# Altium integrated library Mastermind Devices.IntLib: 910 symbols (part 6 of 6)
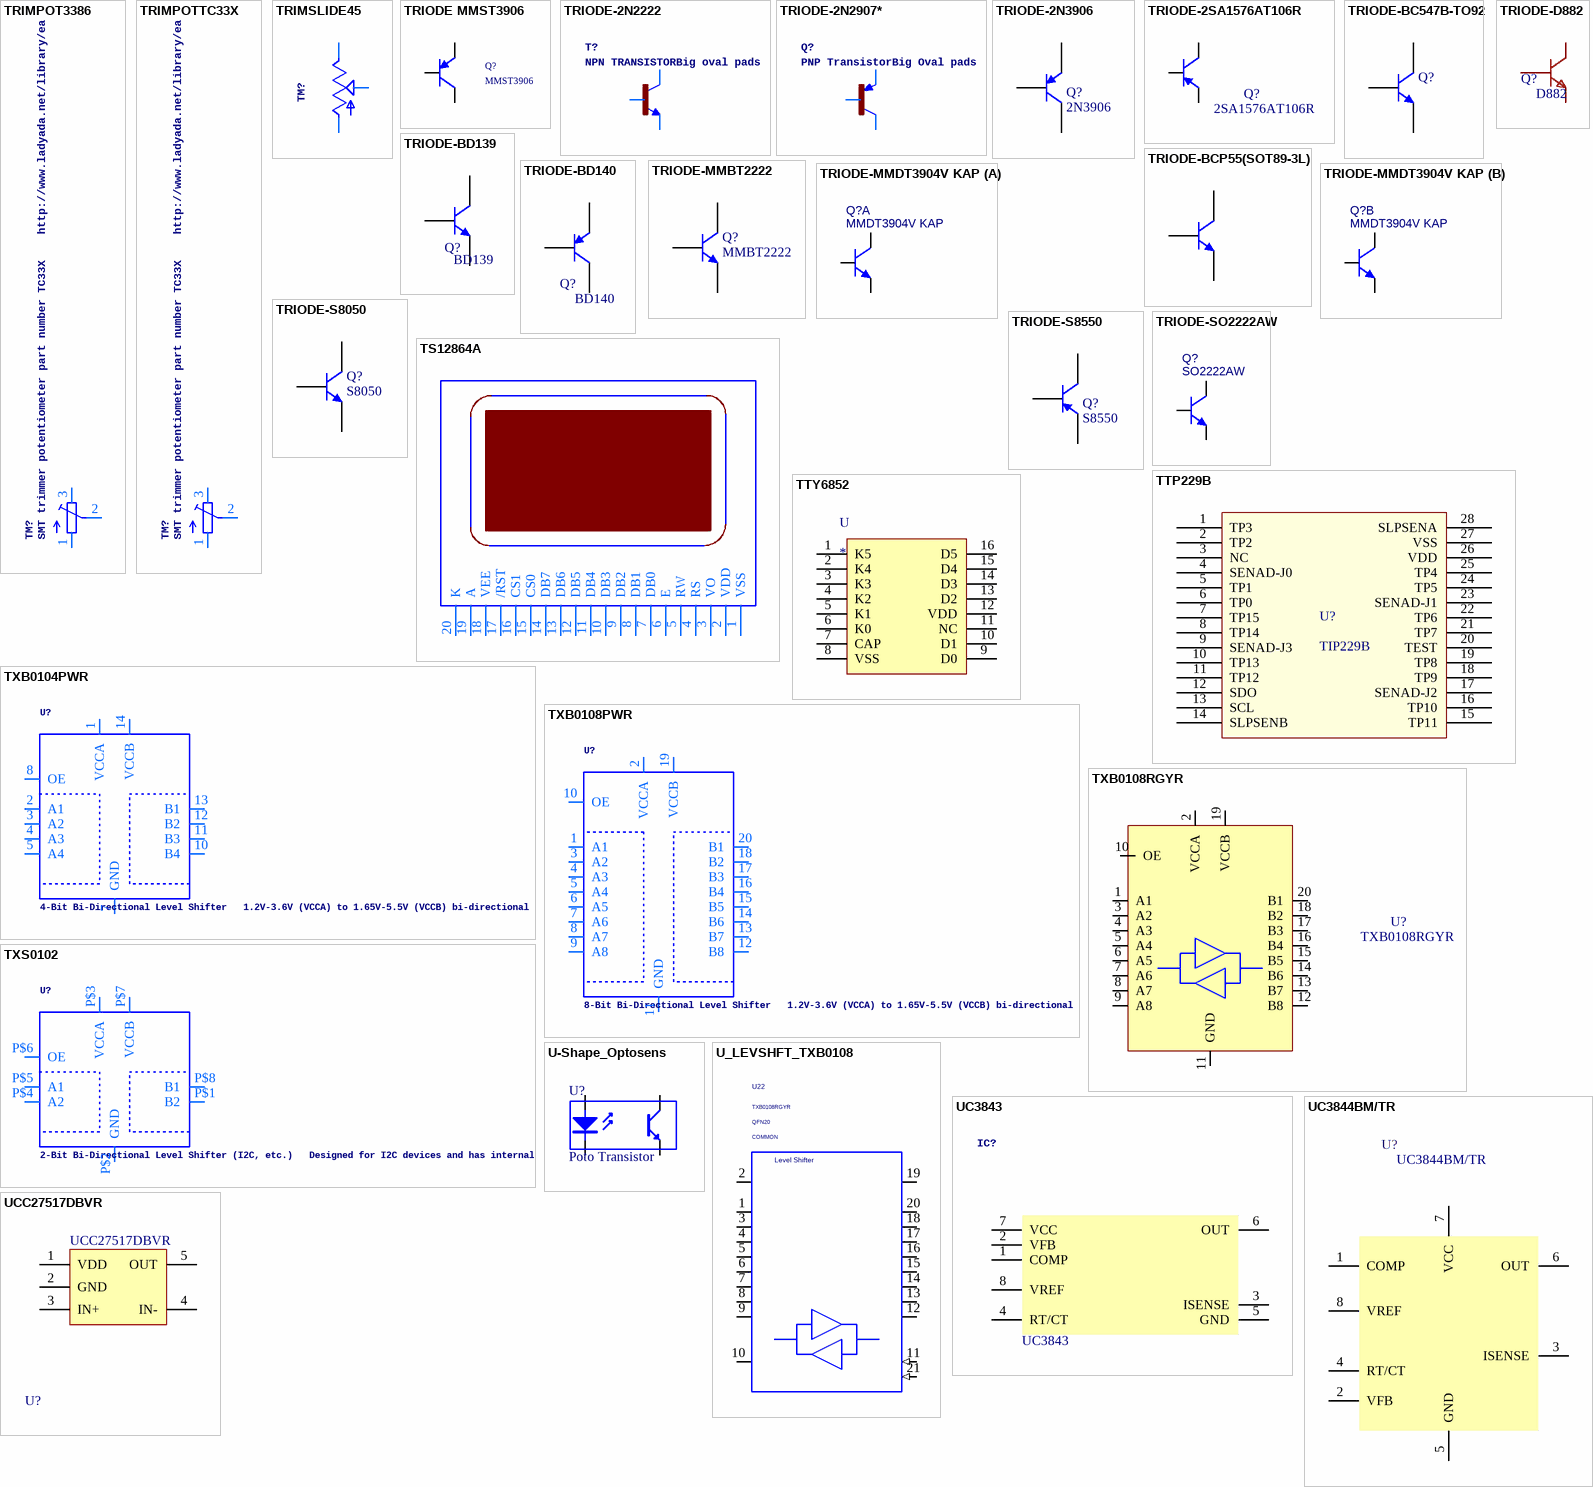
[diagram p44: symbols TRIMPOT3386 to UCC27517DBVR]

## TXB0108PWR
designator U?, comment 8-Bit Bi-Directional Level Shifter   1.2V-3.6V (VCCA) to 1.65V-5.5V (VCCB) bi-directional level shifter with auto direction sensing.    Max data rate - VCCA 1.8V:  20Mbps (50ns), VCCA 3.3V: 100Mbps (10ns)       Digikey: 296-21527-1-ND
footprint TSSOP20
pins: 1 A1, 2 VCCA, 3 A2, 4 A3, 5 A4, 6 A5, 7 A6, 8 A7, 9 A8, 10 OE, 11 GND, 12 B8, 13 B7, 14 B6, 15 B5, 16 B4, 17 B3, 18 B2, 19 VCCB, 20 B1

## TXB0108RGYR
designator U?
1.65V~5.5V 1 8 1.2V~3.6V 100Mbps VQFN-20-EP(3.5x4.5) Translators, Level Shifters ROHS; Manufacturer: TI(德州仪器); Add into BOM: yes; Channel Type: Bidirectional; Number of Circuits: 1; Channels per Circuit: 8; Output Type: Tri-State；Non-inverting; Symbol: TXB0108RGYR; Device: TXB0108RGYR; LCSC Part Name: 100Mbps 8位双向电平转换器; Supplier Part: C194701; Manufacturer Part: TXB0108RGYR; Supplier Footprint: VQFN-20-EP(3.5x4.5); JLCPCB Part Class: Extended Part; Datasheet: https://atta.szlcsc.com/upload/public/pdf/source/20200527/C194701_912976D4DBA928C9D2968FAC041F03B8.pdf; Supplier: LCSC; Convert to PCB: yes; Input Signal: -; Output Signal: -; Data Rate: 100Mbps; Supply Voltage (VCCA): 1.2V~3.6V; Supply Voltage (VCCB): 1.65V~5.5V; Operating Temperature: -40℃~+85℃; Features: Automatic Direction Detection
footprint VQFN-20_L4.5-W3.5-P0.50-BL-EP
3D model VQFN-20_L4.5-W3.5-H1.0-P0.50-BL-EP
pins: 1 A1, 2 VCCA, 3 A2, 4 A3, 5 A4, 6 A5, 7 A6, 8 A7, 9 A8, 10 OE, 11 GND, 12 B8, 13 B7, 14 B6, 15 B5, 16 B4, 17 B3, 18 B2, 19 VCCB, 20 B1, 21 EP hidden to GND

## TXS0102
designator U?, comment 2-Bit Bi-Directional Level Shifter (I2C, etc.)   Designed for I2C devices and has internal pullups.  Not to be confused with TXB010x series.   1.2V-3.6V (VCCA) to 1.65V-5.5V (VCCB) bi-directional level shifter with auto direction sensing.    Max data rate - 24Mbps (Push Pull), 2Mbps (Open Drain)       Digikey: 296-21931-1-ND
footprint VFSOP-8
pins: P$1 B2, P$2 GND, P$3 VCCA, P$4 A2, P$5 A1, P$6 OE, P$7 VCCB, P$8 B1

## U-Shape_Optosens
designator U?, comment Poto Transistor
4-Pin Phototransistor Optocoupler; Published: 24-Mar-1999; LatestRevisionDate: 04-Mar-2005; LatestRevisionNote: Sch pins 3 & 4 Swapped.; DatasheetVersion: Nov-2003; PackageReference: DIP-4; Publisher: Altium Limited
footprint JST_B4B-XH-A(LF)(SN)
footprint JST-PH2.0-4PINS
footprint U_Shape_Opto
pins: 1 A "Anode", 2 K "Cathode", 3 C "Collector", 4 E "Emitter"

## U_LEVSHFT_TXB0108
designator U22  SKU: COMMON  PACK_TYPE: QFN20  NV_NAME: TXB0108RGYR  (hidden comment: U_LEVSHFT_TXB0108)
CDS_PART_NAME: U_LEVSHFT_TXB0108_QFN20-TXB0108RGYR,LEVEL SHIFTER,115-1921-000; CDS_PHYS_PART_NAME: U_LEVSHFT_TXB0108_QFN20-TXB0108RGYR,LEVEL SHIFTER,115-1921-000-115-1921-000; OriginalSymbolOrigin: (-250,350); PATH: I116; NV_PN: 115-1921-000; FUNCTION: Level Shifter; CDS_LMAN_SYM_OUTLINE: -250,350,250,-450; ASSEMBLY: GPIO_HDR; CDS_LIB: digital; CDS_LOCATION: U22; CDS_SEC: 1; DEVICE_TYPENAME: U_LEVSHFT_TXB0108_QFN20-TXB0108RGYRLEVELSHIFTER115-1921-000-115-1921-000; DRAWING: @P3449_B01_LIB.P3449_B01(SCH_1):PAGE19; PHYS_PAGE: 19; ROT: 0; XY: (-9150,5200); PCB Footprint: QFN020R_P050_0045X0035_T031X021_VIAS; PLACEMENT_NOTE: ?; CHIPS_PART_NAME: U_LEVSHFT_TXB0108; LOCATION: U22; SEC_TYPE: QFN20; VER: 1; SEC: 1
footprint QFN020R_P050_0045X0035_T031X021_VIAS
pins: 1 A1 (io), 2 VCCA (power), 3 A2 (io), 4 A3 (io), 5 A4 (io), 6 A5 (io), 7 A6 (io), 8 A7 (io), 9 A8 (io), 10 OE (io), 11 GND (in), 12 B8 (io), 13 B7 (io), 14 B6 (io), 15 B5 (io), 16 B4 (io), 17 B3 (io), 18 B2 (io), 19 VCCB (power), 20 B1 (io), 21 EP (in)

## UC3843
designator IC?  Name: UC3843
footprint SOIC-8E (SOIC, 8-Leads, Body 4.90x3.90mm, Pitch 1.27mm, IPC Medium Density)
pins: 1 COMP (power), 2 VFB, 3 ISENSE, 4 RT/CT (power), 5 GND, 6 OUT, 7 VCC, 8 VREF

## UC3844BM/TR
designator U?
Manufacturer: HGSEMI(华冠); Add into BOM: yes; Symbol: UC3844BM/TR; Device: UC3844BM/TR; LCSC Part Name: UC3844BM/TR; Supplier Part: C2987352; Manufacturer Part: UC3844BM/TR; Supplier Footprint: SOP-8; JLCPCB Part Class: Extended Part; Datasheet: https://atta.szlcsc.com/upload/public/pdf/source/20220406/1010CC7FB2B129E1616D2257145C6E1B.pdf; Supplier: LCSC; Convert to PCB: yes
footprint SOIC-8E (SOIC, 8-Leads, Body 4.90x3.90mm, Pitch 1.27mm, IPC Medium Density)
footprint SOIC-8_L4.9-W3.9-P1.27-LS6.0-BL
pins: 1 COMP (power), 2 VFB, 3 ISENSE, 4 RT/CT (power), 5 GND, 6 OUT, 7 VCC, 8 VREF

## UCC27517DBVR
designator U?
Gate Drive ICs ROHS; Name: UCC27517DBVR
footprint SOT23-5L
pins: 1 VDD, 2 GND, 3 IN+, 4 IN- (power), 5 OUT (power)

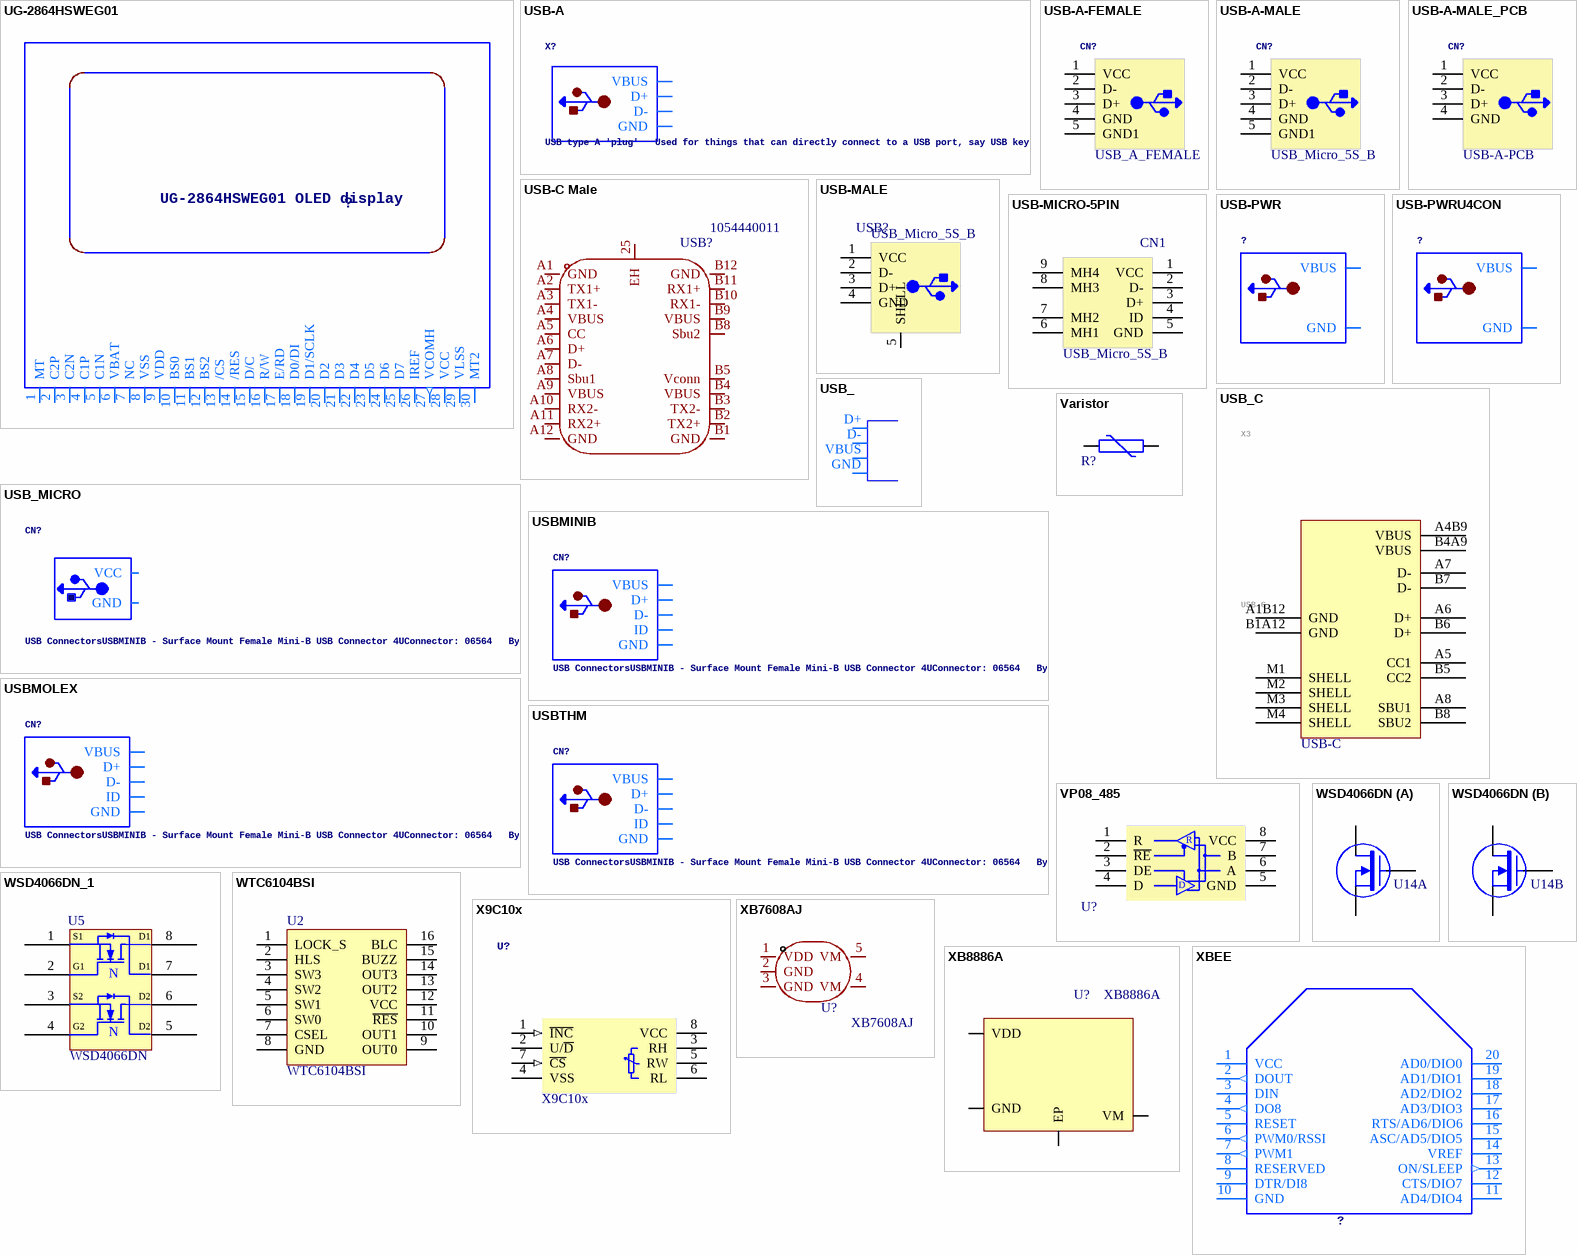
[diagram p37: symbols UG-2864HSWEG01 to XBEE]

## UG-2864HSWEG01
designator ?, comment UG-2864HSWEG01 OLED display
footprint 1X30-0.7MM
pins: 1 MT, 2 C2P, 3 C2N, 4 C1P, 5 C1N, 6 VBAT, 7 NC, 8 VSS (power), 9 VDD (power), 10 BS0, 11 BS1, 12 BS2, 13 /CS, 14 /RES, 15 D/C, 16 R/W, 17 E/RD, 18 D0/DI, 19 D1/SCLK, 20 D2, 21 D3, 22 D4, 23 D5, 24 D6, 25 D7, 26 IREF, 27 VCOMH (out), 28 VCC (power), 29 VLSS (power), 30 MT2

## USB-A
designator X?, comment USB type A 'plug'   Used for things that can directly connect to a USB port, say USB key
footprint MOLEX_480371000
pins: 1 VBUS (power), 2 D-, 3 D+, 4 GND (power)

## USB-A-FEMALE
designator CN?, comment NAME: USB_A_FEMALE  (hidden comment: USB ConnectorsUSBMINIB - Surface Mount Female Mini-B USB Connector 4UConnector: 06564   By microbuilder.euThru-hole RA Female Mini-B USB Connector 4UConnector: 18732   By ladyada.net)
footprint USB-A-SMD_U-A-24DS-Y-1
pins: 1 VCC (power), 2 D-, 3 D+, 4 GND, 5 GND1 (power)

## USB-A-MALE
designator CN?, comment NAME: USB_Micro_5S_B  (hidden comment: USB ConnectorsUSBMINIB - Surface Mount Female Mini-B USB Connector 4UConnector: 06564   By microbuilder.euThru-hole RA Female Mini-B USB Connector 4UConnector: 18732   By ladyada.net)
footprint USB-A-TH_48037-0001
pins: 1 VCC (power), 2 D-, 3 D+, 4 GND, 5 GND1 (power)

## USB-A-MALE_PCB
designator CN?, comment NAME: USB-A-PCB  (hidden comment: USB ConnectorsUSBMINIB - Surface Mount Female Mini-B USB Connector 4UConnector: 06564   By microbuilder.euThru-hole RA Female Mini-B USB Connector 4UConnector: 18732   By ladyada.net)
footprint USB-A-PCB
pins: 1 VCC (power), 2 D-, 3 D+, 4 GND

## USB-C Male
designator USB?, comment 1054440011
Manufacturer: MOLEX; Add into BOM: yes; Connector Type: Type-C; Gender: Male; Number of Contacts: 24P; Number of Ports: 1; Symbol: 1054440011; Device: 1054440011; LCSC Part Name: Type-C 公 夹板; Supplier Part: C561769; Manufacturer Part: 1054440011; Supplier Footprint: SMD; JLCPCB Part Class: Extended Part; Datasheet: https://www.molex.com/content/dam/molex/molex-dot-com/products/automated/en-us/salesdrawingpdf/105/105444/1054440011_sd.pdf?inline\; Supplier: LCSC; Convert to PCB: yes; Protocol Standard: -; Mounting Type: Clamp board; Current Rating-Power: -; Operating Temperature: -
footprint USB-C-SMD_C561769
3D model USB-C-SMD_C561769
pins: 25 EH, A1 GND, A2 TX1+, A3 TX1-, A4 VBUS, A5 CC, A6 D+, A7 D-, A8 Sbu1, A9 VBUS, A10 RX2-, A11 RX2+, A12 GND, B1 GND, B2 TX2+, B3 TX2-, B4 VBUS, B5 Vconn, B8 Sbu2, B9 VBUS, B10 RX1-, B11 RX1+, B12 GND

## USB-MALE
designator USB?, comment NAME: USB_Micro_5S_B  (hidden comment: USB Connectors)
Plugin USB Connectors ROHS
footprint USB-A-TH_48037-0001
footprint USB-A-SMT_48037-0001
pins: 1 VCC (power), 2 D-, 3 D+, 4 GND, 5 SHELL (power)

## USB-MICRO-5PIN
designator CN1, comment NAME: USB_Micro_5S_B  (hidden comment: USB ConnectorsUSBMINIB - Surface Mount Female Mini-B USB Connector 4UConnector: 06564   By microbuilder.euThru-hole RA Female Mini-B USB Connector 4UConnector: 18732   By ladyada.net)
footprint USB-MICRO2.0-5Pin
footprint USB-MICRO-SMD_5P-P0.65-H-M_MICRO-USB-5P
footprint USB-Micro-B-RA-SMD-PiP
pins: 1 VCC (power), 2 D-, 3 D+, 4 ID, 5 GND (power), 6 MH1 (power), 7 MH2 (power), 8 MH3 (power), 9 MH4 (power)

## USB-PWR
designator ?
footprint USB-MINIB-THM-MOLEX-PWRONLY
pins: GND (power), VBUS (power)

## USB-PWRU4CON
designator ?
footprint USB-MINIB-THM-PWRONLY
pins: GND (power), VBUS (power)

## USB_
designator X?, comment USB Connectors   USB-B-PTH is fully proven SKU : PRT-00139    USB-miniB is fully proven SKU : PRT-00587    USB-A-PCB is untested.    USB-A-H is throughly reviewed, but untested. Spark Fun Electronics SKU : PRT-00437    USB-B-SMT is throughly reviewed, but untested. Needs silkscreen touching up.    USB-A-S has not been used/tested    USB-MB-H has not been used/tested  (value not drawn)
footprint USB-A-H - DIP
footprint USB-A-H - DIP
pins: D+, D-, GND, VBUS

## USB_C
designator X3, comment USB C
USB Type-C USB 2.0 Connector; GateName_1: G$1; SymbolName_1: USB_C; LibraryName: adafruit_connector; DeviceSetName: USB_C
footprint USB_C_CUSB31-CFM2AX-01-X
pins: A1B12 GND, A4B9 VBUS, A5 CC1, A6 D+, A7 D-, A8 SBU1, B1A12 GND, B4A9 VBUS, B5 CC2, B6 D+, B7 D-, B8 SBU2, M1 SHELL, M2 SHELL, M3 SHELL, M4 SHELL
text: USB-C

## USB_MICRO
designator CN?, comment USB ConnectorsUSBMINIB - Surface Mount Female Mini-B USB Connector 4UConnector: 06564   By microbuilder.euThru-hole RA Female Mini-B USB Connector 4UConnector: 18732   By ladyada.net
footprint USB-MICRO
pins: GND, VCC

## USBMINIB
designator CN?, comment USB ConnectorsUSBMINIB - Surface Mount Female Mini-B USB Connector 4UConnector: 06564   By microbuilder.euThru-hole RA Female Mini-B USB Connector 4UConnector: 18732   By ladyada.net
footprint USB-MINIB
pins: D+, D-, GND (power), ID, VBUS (power)

## USBMOLEX
designator CN?, comment USB ConnectorsUSBMINIB - Surface Mount Female Mini-B USB Connector 4UConnector: 06564   By microbuilder.euThru-hole RA Female Mini-B USB Connector 4UConnector: 18732   By ladyada.net
footprint USB-MINIB-THM-MOLEX
pins: D+, D-, GND (power), ID, VBUS (power)

## USBTHM
designator CN?, comment USB ConnectorsUSBMINIB - Surface Mount Female Mini-B USB Connector 4UConnector: 06564   By microbuilder.euThru-hole RA Female Mini-B USB Connector 4UConnector: 18732   By ladyada.net
footprint USB-MINIB-THM
pins: D+, D-, GND (power), ID, VBUS (power)

## Varistor
designator R?
footprint MOV (VARISTOR)
footprint MOV - 10 (VARISTOR)
pins: 1, 2

## VP08_485
designator U?, comment VP08  (value not drawn)
RS-485/RS-422 ICs ROHS
footprint SOIC-8E (SOIC, 8-Leads, Body 4.90x3.90mm, Pitch 1.27mm, IPC Medium Density)
pins: 1 R, 2 ~{RE}, 3 DE, 4 D, 5 GND (power), 6 A, 7 B (power), 8 VCC (power)

## WSD4066DN
designator U14  (value not drawn)
footprint DFN-8_L3.2-W3.1-P0.65-LS3.4-BL-EP; pin to pad 6>5+6 8>7+8
part A pins: 1 S1, 2 G1, 8 D1
part B pins: 3 S2, 4 G2, 6 D2

## WSD4066DN_1
designator U5, comment WSD4066DN
BOM_Manufacturer: Winsok Semicon; Contributor: LCSC; BOM_Supplier: LCSC; BOM_Supplier Part: C377861; BOM_Manufacturer Part: WSD4066DN; BOM_JLCPCB Part Class: Extended Part; spicePre: U; spiceSymbolName: WSD4066DN
footprint DFN-8_L3.2-W3.1-P0.65-LS3.4-BL-EP
pins: 1 S1, 2 G1, 3 S2, 4 G2, 5 D2, 6 D2, 7 D1, 8 D1
text: N

## WTC6104BSI
designator U2
TOUCH IC
footprint SO-16
pins: 1 LOCK_S, 2 HLS, 3 SW3, 4 SW2, 5 SW1, 6 SW0, 7 CSEL, 8 GND, 9 OUT0, 10 OUT1, 11 ~{RES}, 12 VCC, 13 OUT2, 14 OUT3, 15 BUZZ, 16 BLC

## X9C10x
designator U?  Name: X9C10x
footprint SOIC-8E (SOIC, 8-Leads, Body 4.90x3.90mm, Pitch 1.27mm, IPC Medium Density)
pins: 1 ~{INC} (in), 2 U/~{D}, 3 RH, 4 VSS, 5 RW, 6 RL, 7 ~{CS} (in), 8 VCC (power)

## XB7608AJ
designator U?
Manufacturer: xysemi(赛芯微); Add into BOM: yes; Symbol: XB7608AJ; Device: XB7608AJ; LCSC Part Name: XB7608AJ; Supplier Part: C2681921; Manufacturer Part: XB7608AJ; Supplier Footprint: CPC-5; JLCPCB Part Class: Extended Part; Datasheet: https://atta.szlcsc.com/upload/public/pdf/source/20201230/C2681921_63F43FD1A79E48A5DEB3B0D5E2CF4C87.pdf; Supplier: LCSC; Convert to PCB: yes
footprint CPC-5_L2.6-W2.6-P0.53-LS4.0-BL
3D model CPC-5_L2.6-W2.6-P0.53-LS4.0-BL
pins: 1 VDD, 2 GND, 3 GND, 4 VM, 5 VM

## XB8886A
designator U?
Manufacturer: xysemi(赛芯微); Add into BOM: yes; Symbol: XB8886A; Device: XB8886A; LCSC Part Name: XB8886A; Supplier Part: C669690; Manufacturer Part: XB8886A; Supplier Footprint: SOP-8-PP; JLCPCB Part Class: Extended Part; Datasheet: https://atta.szlcsc.com/upload/public/pdf/source/20200622/C669690_0063EAE3A52CEE4F89E3070819BC465F.pdf; Supplier: LCSC; Convert to PCB: yes
footprint SOP-8_L4.9-W3.9-P1.27-LS6.0-BL-EP3.5; pin to pad 1>1+2+3+4 5>5+7+8
3D model SOP-8_L4.9-W3.9-P1.27-LS6.0-BL-EP3.5
pins: 1 VM, 5 GND, 6 VDD, 9 EP

## XBEE
designator ?
footprint XBEE
pins: 1 VCC (oe), 2 DOUT (out), 3 DIN, 4 DO8 (out), 5 RESET, 6 PWM0/RSSI (out), 7 PWM1 (out), 8 RESERVED, 9 DTR/DI8, 10 GND (oe), 11 AD4/DIO4, 12 CTS/DIO7, 13 ON/SLEEP (out), 14 VREF, 15 ASC/AD5/DIO5, 16 RTS/AD6/DIO6, 17 AD3/DIO3, 18 AD2/DIO2, 19 AD1/DIO1, 20 AD0/DIO0

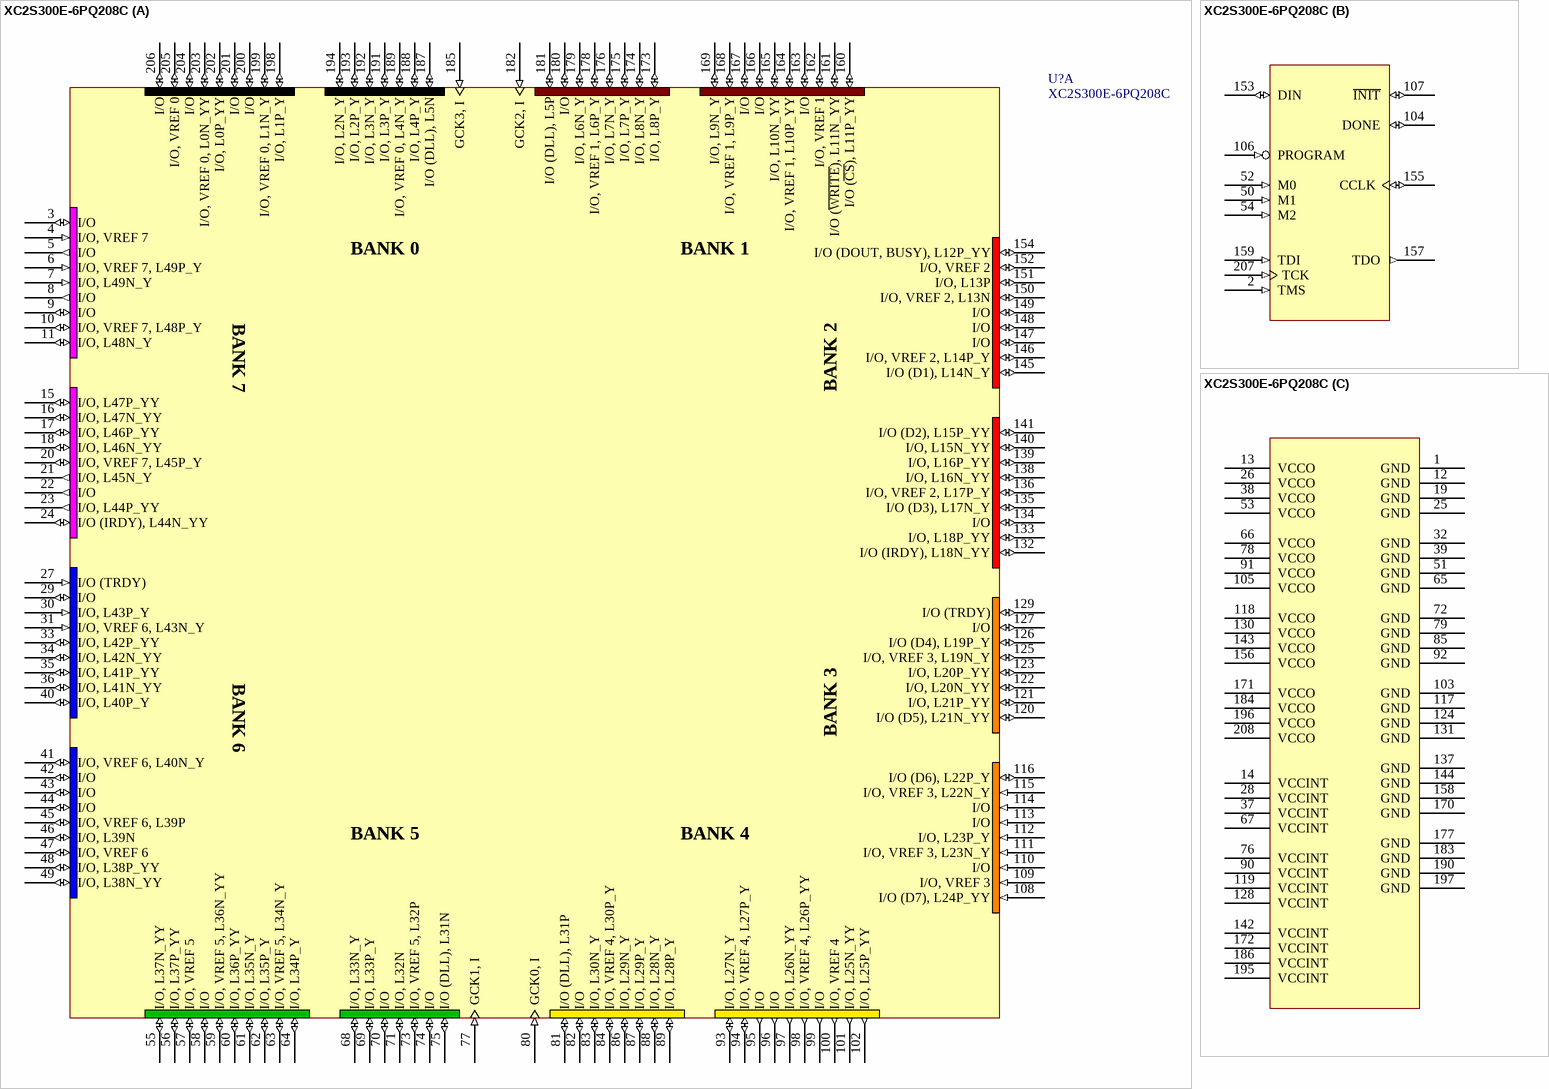
[diagram p38: symbol XC2S300E-6PQ208C]